# Altium footprint library ref-packages.PCBLIB: 1543 footprints (part 75 of 103)
Each footprint in its own frame and in the unit in brackets; x right, y up, seen from the top. Pads: shape width x height; smd on the part's side, far side on the other; paste and mask are expansions set on the pad; w line width, h text height; cw(c..) or ccw(c..) is an arc to the next point about the centre after c.
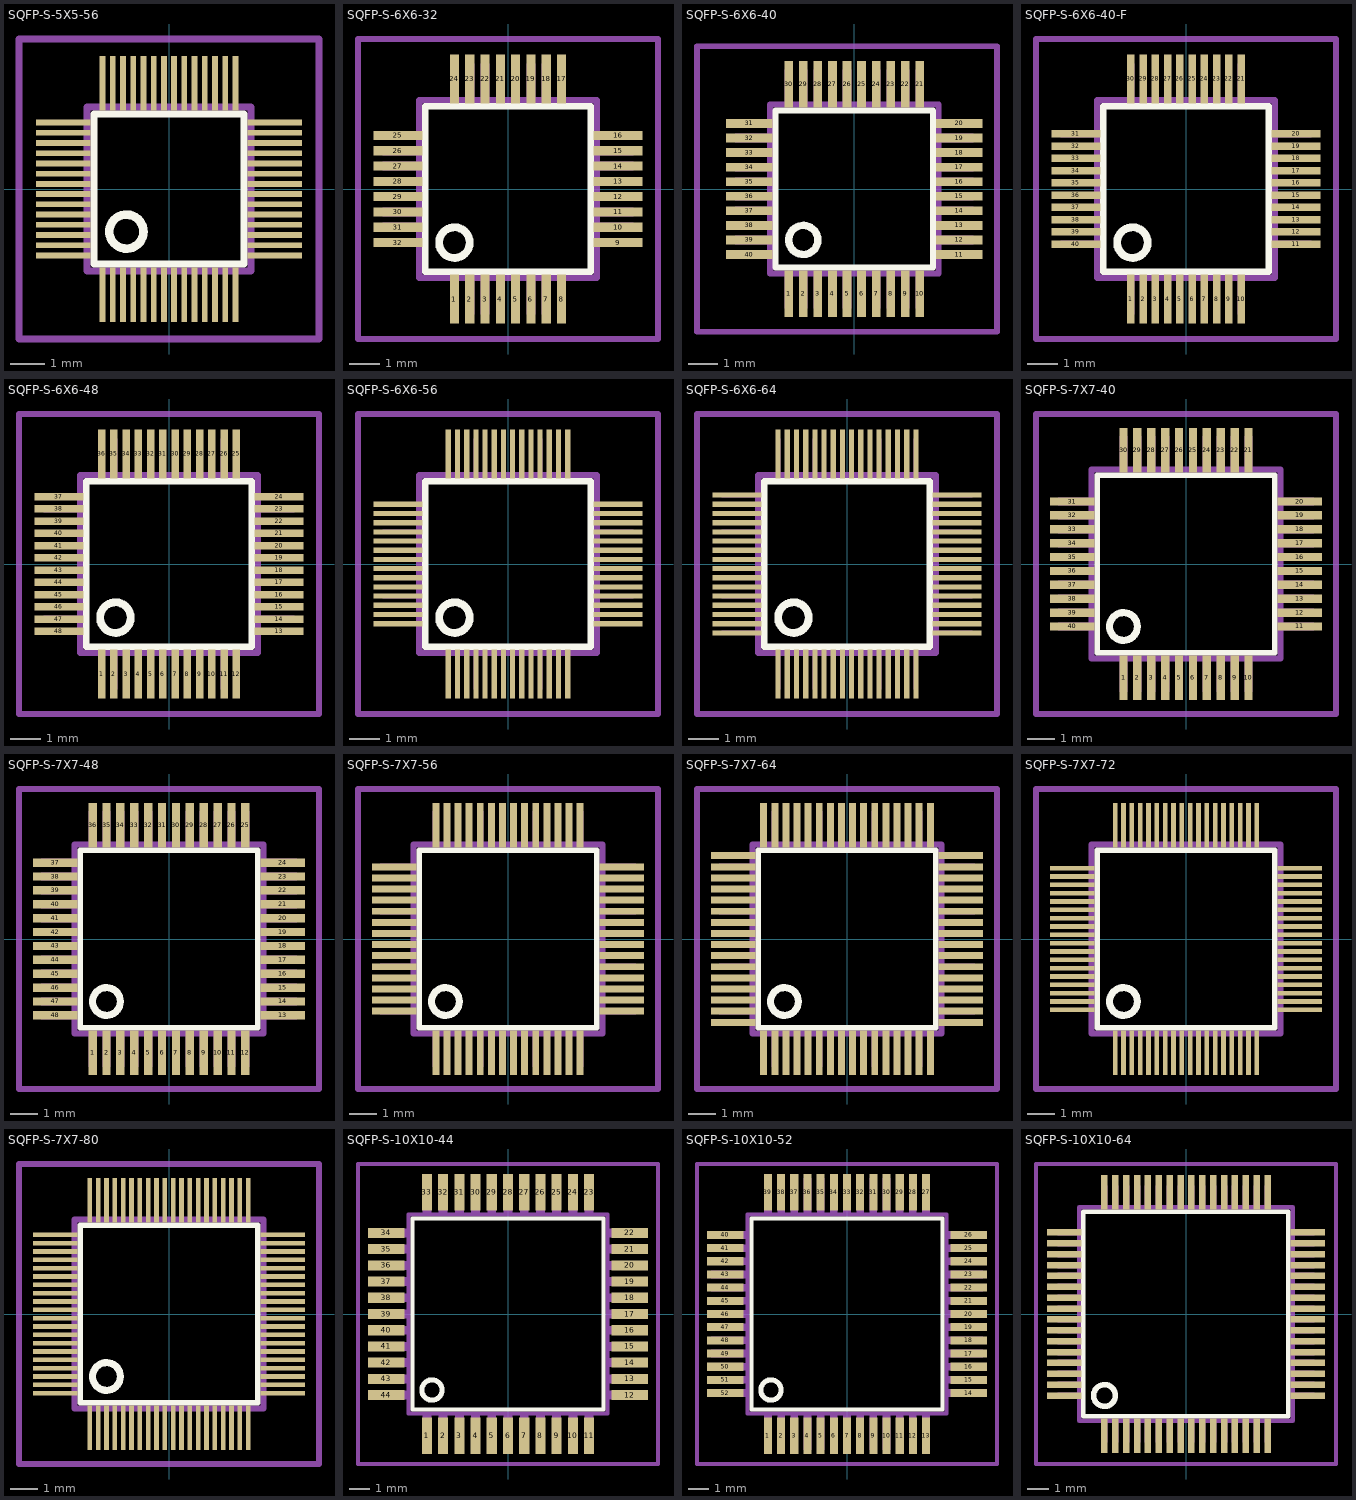
[diagram p74: the footprints below, top view; thin cyan lines are the x and y axes]

## SQFP-S-5X5-56 [mm]
pads (56):
  rect 0.17x1.6 smd: 1(-1.95,-3.1) 2(-1.65,-3.1) 3(-1.35,-3.1) 4(-1.05,-3.1) 5(-0.75,-3.1) 6(-0.45,-3.1) 7(-0.15,-3.1) 8(0.15,-3.1) 9(0.45,-3.1) 10(0.75,-3.1) 11(1.05,-3.1) 12(1.35,-3.1) 13(1.65,-3.1) 14(1.95,-3.1) 29(1.95,3.1) 30(1.65,3.1) 31(1.35,3.1) 32(1.05,3.1) 33(0.75,3.1) 34(0.45,3.1) 35(0.15,3.1) 36(-0.15,3.1) 37(-0.45,3.1) 38(-0.75,3.1) 39(-1.05,3.1) 40(-1.35,3.1) 41(-1.65,3.1) 42(-1.95,3.1)
  rect 1.6x0.17 smd: 15(3.1,-1.95) 16(3.1,-1.65) 17(3.1,-1.35) 18(3.1,-1.05) 19(3.1,-0.75) 20(3.1,-0.45) 21(3.1,-0.15) 22(3.1,0.15) 23(3.1,0.45) 24(3.1,0.75) 25(3.1,1.05) 26(3.1,1.35) 27(3.1,1.65) 28(3.1,1.95) 43(-3.1,1.95) 44(-3.1,1.65) 45(-3.1,1.35) 46(-3.1,1.05) 47(-3.1,0.75) 48(-3.1,0.45) 49(-3.1,0.15) 50(-3.1,-0.15) 51(-3.1,-0.45) 52(-3.1,-0.75) 53(-3.1,-1.05) 54(-3.1,-1.35) 55(-3.1,-1.65) 56(-3.1,-1.95)
Top Overlay:
  circle w0.254: c-1.25,-1.25 r0.5
  lines w0.203: -2.2,-2.2 2.2,-2.2 2.2,2.2 -2.2,2.2 -2.2,-2.2
Mechanical 16:
  rectangle: -2.02,-3.6 -1.88,-2.45
  rectangle: -1.72,-3.6 -1.58,-2.45
  rectangle: -1.42,-3.6 -1.28,-2.45
  rectangle: -1.12,-3.6 -0.98,-2.45
  rectangle: -0.82,-3.6 -0.68,-2.45
  rectangle: -0.52,-3.6 -0.38,-2.45
  rectangle: -0.22,-3.6 -0.08,-2.45
  rectangle: 0.08,-3.6 0.22,-2.45
  rectangle: 0.38,-3.6 0.52,-2.45
  rectangle: 0.68,-3.6 0.82,-2.45
  rectangle: 0.98,-3.6 1.12,-2.45
  rectangle: 1.28,-3.6 1.42,-2.45
  rectangle: 1.58,-3.6 1.72,-2.45
  rectangle: 1.88,-3.6 2.02,-2.45
  rectangle: 2.45,-2.02 3.6,-1.88
  rectangle: 2.45,-1.72 3.6,-1.58
  rectangle: 2.45,-1.42 3.6,-1.28
  rectangle: 2.45,-1.12 3.6,-0.98
  rectangle: 2.45,-0.82 3.6,-0.68
  rectangle: 2.45,-0.52 3.6,-0.38
  rectangle: 2.45,-0.22 3.6,-0.08
  rectangle: 2.45,0.08 3.6,0.22
  rectangle: 2.45,0.38 3.6,0.52
  rectangle: 2.45,0.68 3.6,0.82
  rectangle: 2.45,0.98 3.6,1.12
  rectangle: 2.45,1.28 3.6,1.42
  rectangle: 2.45,1.58 3.6,1.72
  rectangle: 2.45,1.88 3.6,2.02
  rectangle: 1.88,2.45 2.02,3.6
  rectangle: 1.58,2.45 1.72,3.6
  rectangle: 1.28,2.45 1.42,3.6
  rectangle: 0.98,2.45 1.12,3.6
  rectangle: 0.68,2.45 0.82,3.6
  rectangle: 0.38,2.45 0.52,3.6
  rectangle: 0.08,2.45 0.22,3.6
  rectangle: -0.22,2.45 -0.08,3.6
  rectangle: -0.52,2.45 -0.38,3.6
  rectangle: -0.82,2.45 -0.68,3.6
  rectangle: -1.12,2.45 -0.98,3.6
  rectangle: -1.42,2.45 -1.28,3.6
  rectangle: -1.72,2.45 -1.58,3.6
  rectangle: -2.02,2.45 -1.88,3.6
  rectangle: -3.6,1.88 -2.45,2.02
  rectangle: -3.6,1.58 -2.45,1.72
  rectangle: -3.6,1.28 -2.45,1.42
  rectangle: -3.6,0.98 -2.45,1.12
  rectangle: -3.6,0.68 -2.45,0.82
  rectangle: -3.6,0.38 -2.45,0.52
  rectangle: -3.6,0.08 -2.45,0.22
  rectangle: -3.6,-0.22 -2.45,-0.08
  rectangle: -3.6,-0.52 -2.45,-0.38
  rectangle: -3.6,-0.82 -2.45,-0.68
  rectangle: -3.6,-1.12 -2.45,-0.98
  rectangle: -3.6,-1.42 -2.45,-1.28
  rectangle: -3.6,-1.72 -2.45,-1.58
  rectangle: -3.6,-2.02 -2.45,-1.88
  lines w0.203: -2.4,-2.4 2.4,-2.4 2.4,2.4 -2.4,2.4 -2.4,-2.4
Mechanical 27:
  lines w0.2: -4.4,-4.4 -4.4,4.4 4.4,4.4 4.4,-4.4 -4.4,-4.4

## SQFP-S-6X6-32 [mil]
pads (32):
  rect 11.81x62.99 smd: 1(-68.9,-141.73) 2(-49.21,-141.73) 3(-29.53,-141.73) 4(-9.84,-141.73) 5(9.84,-141.73) 6(29.53,-141.73) 7(49.21,-141.73) 8(68.9,-141.73) 17(68.9,141.73) 18(49.21,141.73) 19(29.53,141.73) 20(9.84,141.73) 21(-9.84,141.73) 22(-29.53,141.73) 23(-49.21,141.73) 24(-68.9,141.73)
  rect 62.99x11.81 smd: 9(141.73,-68.9) 10(141.73,-49.21) 11(141.73,-29.53) 12(141.73,-9.84) 13(141.73,9.84) 14(141.73,29.53) 15(141.73,49.21) 16(141.73,68.9) 25(-141.73,68.9) 26(-141.73,49.21) 27(-141.73,29.53) 28(-141.73,9.84) 29(-141.73,-9.84) 30(-141.73,-29.53) 31(-141.73,-49.21) 32(-141.73,-68.9)
Top Overlay:
  circle w10: c-68.9,-68.9 r19.69
  lines w8: -106.3,-106.3 106.3,-106.3 106.3,106.3 -106.3,106.3 -106.3,-106.3
Mechanical 16:
  rectangle: -74.8,-161.42 -62.99,-116.14
  rectangle: -55.12,-161.42 -43.31,-116.14
  rectangle: -35.43,-161.42 -23.62,-116.14
  rectangle: -15.75,-161.42 -3.94,-116.14
  rectangle: 3.94,-161.42 15.75,-116.14
  rectangle: 23.62,-161.42 35.43,-116.14
  rectangle: 43.31,-161.42 55.12,-116.14
  rectangle: 62.99,-161.42 74.8,-116.14
  rectangle: 116.14,-74.8 161.42,-62.99
  rectangle: 116.14,-55.12 161.42,-43.31
  rectangle: 116.14,-35.43 161.42,-23.62
  rectangle: 116.14,-15.75 161.42,-3.94
  rectangle: 116.14,3.94 161.42,15.75
  rectangle: 116.14,23.62 161.42,35.43
  rectangle: 116.14,43.31 161.42,55.12
  rectangle: 116.14,62.99 161.42,74.8
  rectangle: 62.99,116.14 74.8,161.42
  rectangle: 43.31,116.14 55.12,161.42
  rectangle: 23.62,116.14 35.43,161.42
  rectangle: 3.94,116.14 15.75,161.42
  rectangle: -15.75,116.14 -3.94,161.42
  rectangle: -35.43,116.14 -23.62,161.42
  rectangle: -55.12,116.14 -43.31,161.42
  rectangle: -74.8,116.14 -62.99,161.42
  rectangle: -161.42,62.99 -116.14,74.8
  rectangle: -161.42,43.31 -116.14,55.12
  rectangle: -161.42,23.62 -116.14,35.43
  rectangle: -161.42,3.94 -116.14,15.75
  rectangle: -161.42,-15.75 -116.14,-3.94
  rectangle: -161.42,-35.43 -116.14,-23.62
  rectangle: -161.42,-55.12 -116.14,-43.31
  rectangle: -161.42,-74.8 -116.14,-62.99
  lines w8: -114.17,-114.17 114.17,-114.17 114.17,114.17 -114.17,114.17 -114.17,-114.17
Mechanical 27:
  lines w7.87: -192.91,-192.91 -192.91,192.91 192.91,192.91 192.91,-192.91 -192.91,-192.91

## SQFP-S-6X6-40 [mil]
pads (40):
  rect 11.81x62.99 smd: 1(-88.58,-141.73) 2(-68.9,-141.73) 3(-49.21,-141.73) 4(-29.53,-141.73) 5(-9.84,-141.73) 6(9.84,-141.73) 7(29.53,-141.73) 8(49.21,-141.73) 9(68.9,-141.73) 10(88.58,-141.73) 21(88.58,141.73) 22(68.9,141.73) 23(49.21,141.73) 24(29.53,141.73) 25(9.84,141.73) 26(-9.84,141.73) 27(-29.53,141.73) 28(-49.21,141.73) 29(-68.9,141.73) 30(-88.58,141.73)
  rect 62.99x11.81 smd: 11(141.73,-88.58) 12(141.73,-68.9) 13(141.73,-49.21) 14(141.73,-29.53) 15(141.73,-9.84) 16(141.73,9.84) 17(141.73,29.53) 18(141.73,49.21) 19(141.73,68.9) 20(141.73,88.58) 31(-141.73,88.58) 32(-141.73,68.9) 33(-141.73,49.21) 34(-141.73,29.53) 35(-141.73,9.84) 36(-141.73,-9.84) 37(-141.73,-29.53) 38(-141.73,-49.21) 39(-141.73,-68.9) 40(-141.73,-88.58)
Top Overlay:
  circle w10: c-68.9,-68.9 r19.69
  lines w8: -106.3,-106.3 106.3,-106.3 106.3,106.3 -106.3,106.3 -106.3,-106.3
Mechanical 16:
  rectangle: -94.49,-161.42 -82.68,-116.14
  rectangle: -74.8,-161.42 -62.99,-116.14
  rectangle: -55.12,-161.42 -43.31,-116.14
  rectangle: -35.43,-161.42 -23.62,-116.14
  rectangle: -15.75,-161.42 -3.94,-116.14
  rectangle: 3.94,-161.42 15.75,-116.14
  rectangle: 23.62,-161.42 35.43,-116.14
  rectangle: 43.31,-161.42 55.12,-116.14
  rectangle: 62.99,-161.42 74.8,-116.14
  rectangle: 82.68,-161.42 94.49,-116.14
  rectangle: 116.14,-94.49 161.42,-82.68
  rectangle: 116.14,-74.8 161.42,-62.99
  rectangle: 116.14,-55.12 161.42,-43.31
  rectangle: 116.14,-35.43 161.42,-23.62
  rectangle: 116.14,-15.75 161.42,-3.94
  rectangle: 116.14,3.94 161.42,15.75
  rectangle: 116.14,23.62 161.42,35.43
  rectangle: 116.14,43.31 161.42,55.12
  rectangle: 116.14,62.99 161.42,74.8
  rectangle: 116.14,82.68 161.42,94.49
  rectangle: 82.68,116.14 94.49,161.42
  rectangle: 62.99,116.14 74.8,161.42
  rectangle: 43.31,116.14 55.12,161.42
  rectangle: 23.62,116.14 35.43,161.42
  rectangle: 3.94,116.14 15.75,161.42
  rectangle: -15.75,116.14 -3.94,161.42
  rectangle: -35.43,116.14 -23.62,161.42
  rectangle: -55.12,116.14 -43.31,161.42
  rectangle: -74.8,116.14 -62.99,161.42
  rectangle: -94.49,116.14 -82.68,161.42
  rectangle: -161.42,82.68 -116.14,94.49
  rectangle: -161.42,62.99 -116.14,74.8
  rectangle: -161.42,43.31 -116.14,55.12
  rectangle: -161.42,23.62 -116.14,35.43
  rectangle: -161.42,3.94 -116.14,15.75
  rectangle: -161.42,-15.75 -116.14,-3.94
  rectangle: -161.42,-35.43 -116.14,-23.62
  rectangle: -161.42,-55.12 -116.14,-43.31
  rectangle: -161.42,-74.8 -116.14,-62.99
  rectangle: -161.42,-94.49 -116.14,-82.68
  lines w8: -114.17,-114.17 114.17,-114.17 114.17,114.17 -114.17,114.17 -114.17,-114.17
Mechanical 27:
  lines w7.87: -212.6,-192.91 -212.6,192.91 192.91,192.91 192.91,-192.91 -212.6,-192.91

## SQFP-S-6X6-40-F [mm]
pads (40):
  rect 0.25x1.6 smd: 1(-1.8,-3.6) 2(-1.4,-3.6) 3(-1,-3.6) 4(-0.6,-3.6) 5(-0.2,-3.6) 6(0.2,-3.6) 7(0.6,-3.6) 8(1,-3.6) 9(1.4,-3.6) 10(1.8,-3.6) 21(1.8,3.6) 22(1.4,3.6) 23(1,3.6) 24(0.6,3.6) 25(0.2,3.6) 26(-0.2,3.6) 27(-0.6,3.6) 28(-1,3.6) 29(-1.4,3.6) 30(-1.8,3.6)
  rect 1.6x0.25 smd: 11(3.6,-1.8) 12(3.6,-1.4) 13(3.6,-1) 14(3.6,-0.6) 15(3.6,-0.2) 16(3.6,0.2) 17(3.6,0.6) 18(3.6,1) 19(3.6,1.4) 20(3.6,1.8) 31(-3.6,1.8) 32(-3.6,1.4) 33(-3.6,1) 34(-3.6,0.6) 35(-3.6,0.2) 36(-3.6,-0.2) 37(-3.6,-0.6) 38(-3.6,-1) 39(-3.6,-1.4) 40(-3.6,-1.8)
Top Overlay:
  circle w0.254: c-1.75,-1.75 r0.5
  lines w0.203: -2.7,-2.7 2.7,-2.7 2.7,2.7 -2.7,2.7 -2.7,-2.7
Mechanical 16:
  rectangle: -1.91,-4.1 -1.69,-2.95
  rectangle: -1.51,-4.1 -1.29,-2.95
  rectangle: -1.11,-4.1 -0.89,-2.95
  rectangle: -0.71,-4.1 -0.49,-2.95
  rectangle: -0.31,-4.1 -0.09,-2.95
  rectangle: 0.09,-4.1 0.31,-2.95
  rectangle: 0.49,-4.1 0.71,-2.95
  rectangle: 0.89,-4.1 1.11,-2.95
  rectangle: 1.29,-4.1 1.51,-2.95
  rectangle: 1.69,-4.1 1.91,-2.95
  rectangle: 2.95,-1.91 4.1,-1.69
  rectangle: 2.95,-1.51 4.1,-1.29
  rectangle: 2.95,-1.11 4.1,-0.89
  rectangle: 2.95,-0.71 4.1,-0.49
  rectangle: 2.95,-0.31 4.1,-0.09
  rectangle: 2.95,0.09 4.1,0.31
  rectangle: 2.95,0.49 4.1,0.71
  rectangle: 2.95,0.89 4.1,1.11
  rectangle: 2.95,1.29 4.1,1.51
  rectangle: 2.95,1.69 4.1,1.91
  rectangle: 1.69,2.95 1.91,4.1
  rectangle: 1.29,2.95 1.51,4.1
  rectangle: 0.89,2.95 1.11,4.1
  rectangle: 0.49,2.95 0.71,4.1
  rectangle: 0.09,2.95 0.31,4.1
  rectangle: -0.31,2.95 -0.09,4.1
  rectangle: -0.71,2.95 -0.49,4.1
  rectangle: -1.11,2.95 -0.89,4.1
  rectangle: -1.51,2.95 -1.29,4.1
  rectangle: -1.91,2.95 -1.69,4.1
  rectangle: -4.1,1.69 -2.95,1.91
  rectangle: -4.1,1.29 -2.95,1.51
  rectangle: -4.1,0.89 -2.95,1.11
  rectangle: -4.1,0.49 -2.95,0.71
  rectangle: -4.1,0.09 -2.95,0.31
  rectangle: -4.1,-0.31 -2.95,-0.09
  rectangle: -4.1,-0.71 -2.95,-0.49
  rectangle: -4.1,-1.11 -2.95,-0.89
  rectangle: -4.1,-1.51 -2.95,-1.29
  rectangle: -4.1,-1.91 -2.95,-1.69
  lines w0.203: -2.9,-2.9 2.9,-2.9 2.9,2.9 -2.9,2.9 -2.9,-2.9
Mechanical 27:
  lines w0.2: -4.9,-4.9 -4.9,4.9 4.9,4.9 4.9,-4.9 -4.9,-4.9

## SQFP-S-6X6-48 [mm]
pads (48):
  rect 0.25x1.6 smd: 1(-2.2,-3.6) 2(-1.8,-3.6) 3(-1.4,-3.6) 4(-1,-3.6) 5(-0.6,-3.6) 6(-0.2,-3.6) 7(0.2,-3.6) 8(0.6,-3.6) 9(1,-3.6) 10(1.4,-3.6) 11(1.8,-3.6) 12(2.2,-3.6) 25(2.2,3.6) 26(1.8,3.6) 27(1.4,3.6) 28(1,3.6) 29(0.6,3.6) 30(0.2,3.6) 31(-0.2,3.6) 32(-0.6,3.6) 33(-1,3.6) 34(-1.4,3.6) 35(-1.8,3.6) 36(-2.2,3.6)
  rect 1.6x0.25 smd: 13(3.6,-2.2) 14(3.6,-1.8) 15(3.6,-1.4) 16(3.6,-1) 17(3.6,-0.6) 18(3.6,-0.2) 19(3.6,0.2) 20(3.6,0.6) 21(3.6,1) 22(3.6,1.4) 23(3.6,1.8) 24(3.6,2.2) 37(-3.6,2.2) 38(-3.6,1.8) 39(-3.6,1.4) 40(-3.6,1) 41(-3.6,0.6) 42(-3.6,0.2) 43(-3.6,-0.2) 44(-3.6,-0.6) 45(-3.6,-1) 46(-3.6,-1.4) 47(-3.6,-1.8) 48(-3.6,-2.2)
Top Overlay:
  circle w0.254: c-1.75,-1.75 r0.5
  lines w0.203: -2.7,-2.7 2.7,-2.7 2.7,2.7 -2.7,2.7 -2.7,-2.7
Mechanical 16:
  rectangle: -2.31,-4.1 -2.09,-2.95
  rectangle: -1.91,-4.1 -1.69,-2.95
  rectangle: -1.51,-4.1 -1.29,-2.95
  rectangle: -1.11,-4.1 -0.89,-2.95
  rectangle: -0.71,-4.1 -0.49,-2.95
  rectangle: -0.31,-4.1 -0.09,-2.95
  rectangle: 0.09,-4.1 0.31,-2.95
  rectangle: 0.49,-4.1 0.71,-2.95
  rectangle: 0.89,-4.1 1.11,-2.95
  rectangle: 1.29,-4.1 1.51,-2.95
  rectangle: 1.69,-4.1 1.91,-2.95
  rectangle: 2.09,-4.1 2.31,-2.95
  rectangle: 2.95,-2.31 4.1,-2.09
  rectangle: 2.95,-1.91 4.1,-1.69
  rectangle: 2.95,-1.51 4.1,-1.29
  rectangle: 2.95,-1.11 4.1,-0.89
  rectangle: 2.95,-0.71 4.1,-0.49
  rectangle: 2.95,-0.31 4.1,-0.09
  rectangle: 2.95,0.09 4.1,0.31
  rectangle: 2.95,0.49 4.1,0.71
  rectangle: 2.95,0.89 4.1,1.11
  rectangle: 2.95,1.29 4.1,1.51
  rectangle: 2.95,1.69 4.1,1.91
  rectangle: 2.95,2.09 4.1,2.31
  rectangle: 2.09,2.95 2.31,4.1
  rectangle: 1.69,2.95 1.91,4.1
  rectangle: 1.29,2.95 1.51,4.1
  rectangle: 0.89,2.95 1.11,4.1
  rectangle: 0.49,2.95 0.71,4.1
  rectangle: 0.09,2.95 0.31,4.1
  rectangle: -0.31,2.95 -0.09,4.1
  rectangle: -0.71,2.95 -0.49,4.1
  rectangle: -1.11,2.95 -0.89,4.1
  rectangle: -1.51,2.95 -1.29,4.1
  rectangle: -1.91,2.95 -1.69,4.1
  rectangle: -2.31,2.95 -2.09,4.1
  rectangle: -4.1,2.09 -2.95,2.31
  rectangle: -4.1,1.69 -2.95,1.91
  rectangle: -4.1,1.29 -2.95,1.51
  rectangle: -4.1,0.89 -2.95,1.11
  rectangle: -4.1,0.49 -2.95,0.71
  rectangle: -4.1,0.09 -2.95,0.31
  rectangle: -4.1,-0.31 -2.95,-0.09
  rectangle: -4.1,-0.71 -2.95,-0.49
  rectangle: -4.1,-1.11 -2.95,-0.89
  rectangle: -4.1,-1.51 -2.95,-1.29
  rectangle: -4.1,-1.91 -2.95,-1.69
  rectangle: -4.1,-2.31 -2.95,-2.09
  lines w0.203: -2.9,-2.9 2.9,-2.9 2.9,2.9 -2.9,2.9 -2.9,-2.9
Mechanical 27:
  lines w0.2: -4.9,-4.9 -4.9,4.9 4.9,4.9 4.9,-4.9 -4.9,-4.9

## SQFP-S-6X6-56 [mm]
pads (56):
  rect 0.17x1.6 smd: 1(-1.95,-3.6) 2(-1.65,-3.6) 3(-1.35,-3.6) 4(-1.05,-3.6) 5(-0.75,-3.6) 6(-0.45,-3.6) 7(-0.15,-3.6) 8(0.15,-3.6) 9(0.45,-3.6) 10(0.75,-3.6) 11(1.05,-3.6) 12(1.35,-3.6) 13(1.65,-3.6) 14(1.95,-3.6) 29(1.95,3.6) 30(1.65,3.6) 31(1.35,3.6) 32(1.05,3.6) 33(0.75,3.6) 34(0.45,3.6) 35(0.15,3.6) 36(-0.15,3.6) 37(-0.45,3.6) 38(-0.75,3.6) 39(-1.05,3.6) 40(-1.35,3.6) 41(-1.65,3.6) 42(-1.95,3.6)
  rect 1.6x0.17 smd: 15(3.6,-1.95) 16(3.6,-1.65) 17(3.6,-1.35) 18(3.6,-1.05) 19(3.6,-0.75) 20(3.6,-0.45) 21(3.6,-0.15) 22(3.6,0.15) 23(3.6,0.45) 24(3.6,0.75) 25(3.6,1.05) 26(3.6,1.35) 27(3.6,1.65) 28(3.6,1.95) 43(-3.6,1.95) 44(-3.6,1.65) 45(-3.6,1.35) 46(-3.6,1.05) 47(-3.6,0.75) 48(-3.6,0.45) 49(-3.6,0.15) 50(-3.6,-0.15) 51(-3.6,-0.45) 52(-3.6,-0.75) 53(-3.6,-1.05) 54(-3.6,-1.35) 55(-3.6,-1.65) 56(-3.6,-1.95)
Top Overlay:
  circle w0.254: c-1.75,-1.75 r0.5
  lines w0.203: -2.7,-2.7 2.7,-2.7 2.7,2.7 -2.7,2.7 -2.7,-2.7
Mechanical 16:
  rectangle: -2.02,-4.1 -1.88,-2.95
  rectangle: -1.72,-4.1 -1.58,-2.95
  rectangle: -1.42,-4.1 -1.28,-2.95
  rectangle: -1.12,-4.1 -0.98,-2.95
  rectangle: -0.82,-4.1 -0.68,-2.95
  rectangle: -0.52,-4.1 -0.38,-2.95
  rectangle: -0.22,-4.1 -0.08,-2.95
  rectangle: 0.08,-4.1 0.22,-2.95
  rectangle: 0.38,-4.1 0.52,-2.95
  rectangle: 0.68,-4.1 0.82,-2.95
  rectangle: 0.98,-4.1 1.12,-2.95
  rectangle: 1.28,-4.1 1.42,-2.95
  rectangle: 1.58,-4.1 1.72,-2.95
  rectangle: 1.88,-4.1 2.02,-2.95
  rectangle: 2.95,-2.02 4.1,-1.88
  rectangle: 2.95,-1.72 4.1,-1.58
  rectangle: 2.95,-1.42 4.1,-1.28
  rectangle: 2.95,-1.12 4.1,-0.98
  rectangle: 2.95,-0.82 4.1,-0.68
  rectangle: 2.95,-0.52 4.1,-0.38
  rectangle: 2.95,-0.22 4.1,-0.08
  rectangle: 2.95,0.08 4.1,0.22
  rectangle: 2.95,0.38 4.1,0.52
  rectangle: 2.95,0.68 4.1,0.82
  rectangle: 2.95,0.98 4.1,1.12
  rectangle: 2.95,1.28 4.1,1.42
  rectangle: 2.95,1.58 4.1,1.72
  rectangle: 2.95,1.88 4.1,2.02
  rectangle: 1.88,2.95 2.02,4.1
  rectangle: 1.58,2.95 1.72,4.1
  rectangle: 1.28,2.95 1.42,4.1
  rectangle: 0.98,2.95 1.12,4.1
  rectangle: 0.68,2.95 0.82,4.1
  rectangle: 0.38,2.95 0.52,4.1
  rectangle: 0.08,2.95 0.22,4.1
  rectangle: -0.22,2.95 -0.08,4.1
  rectangle: -0.52,2.95 -0.38,4.1
  rectangle: -0.82,2.95 -0.68,4.1
  rectangle: -1.12,2.95 -0.98,4.1
  rectangle: -1.42,2.95 -1.28,4.1
  rectangle: -1.72,2.95 -1.58,4.1
  rectangle: -2.02,2.95 -1.88,4.1
  rectangle: -4.1,1.88 -2.95,2.02
  rectangle: -4.1,1.58 -2.95,1.72
  rectangle: -4.1,1.28 -2.95,1.42
  rectangle: -4.1,0.98 -2.95,1.12
  rectangle: -4.1,0.68 -2.95,0.82
  rectangle: -4.1,0.38 -2.95,0.52
  rectangle: -4.1,0.08 -2.95,0.22
  rectangle: -4.1,-0.22 -2.95,-0.08
  rectangle: -4.1,-0.52 -2.95,-0.38
  rectangle: -4.1,-0.82 -2.95,-0.68
  rectangle: -4.1,-1.12 -2.95,-0.98
  rectangle: -4.1,-1.42 -2.95,-1.28
  rectangle: -4.1,-1.72 -2.95,-1.58
  rectangle: -4.1,-2.02 -2.95,-1.88
  lines w0.203: -2.9,-2.9 2.9,-2.9 2.9,2.9 -2.9,2.9 -2.9,-2.9
Mechanical 27:
  lines w0.2: -4.9,-4.9 -4.9,4.9 4.9,4.9 4.9,-4.9 -4.9,-4.9

## SQFP-S-6X6-64 [mm]
pads (64):
  rect 0.17x1.6 smd: 1(-2.25,-3.6) 2(-1.95,-3.6) 3(-1.65,-3.6) 4(-1.35,-3.6) 5(-1.05,-3.6) 6(-0.75,-3.6) 7(-0.45,-3.6) 8(-0.15,-3.6) 9(0.15,-3.6) 10(0.45,-3.6) 11(0.75,-3.6) 12(1.05,-3.6) 13(1.35,-3.6) 14(1.65,-3.6) 15(1.95,-3.6) 16(2.25,-3.6) 33(2.25,3.6) 34(1.95,3.6) 35(1.65,3.6) 36(1.35,3.6) 37(1.05,3.6) 38(0.75,3.6) 39(0.45,3.6) 40(0.15,3.6) 41(-0.15,3.6) 42(-0.45,3.6) 43(-0.75,3.6) 44(-1.05,3.6) 45(-1.35,3.6) 46(-1.65,3.6) 47(-1.95,3.6) 48(-2.25,3.6)
  rect 1.6x0.17 smd: 17(3.6,-2.25) 18(3.6,-1.95) 19(3.6,-1.65) 20(3.6,-1.35) 21(3.6,-1.05) 22(3.6,-0.75) 23(3.6,-0.45) 24(3.6,-0.15) 25(3.6,0.15) 26(3.6,0.45) 27(3.6,0.75) 28(3.6,1.05) 29(3.6,1.35) 30(3.6,1.65) 31(3.6,1.95) 32(3.6,2.25) 49(-3.6,2.25) 50(-3.6,1.95) 51(-3.6,1.65) 52(-3.6,1.35) 53(-3.6,1.05) 54(-3.6,0.75) 55(-3.6,0.45) 56(-3.6,0.15) 57(-3.6,-0.15) 58(-3.6,-0.45) 59(-3.6,-0.75) 60(-3.6,-1.05) 61(-3.6,-1.35) 62(-3.6,-1.65) 63(-3.6,-1.95) 64(-3.6,-2.25)
Top Overlay:
  circle w0.254: c-1.75,-1.75 r0.5
  lines w0.203: -2.7,-2.7 2.7,-2.7 2.7,2.7 -2.7,2.7 -2.7,-2.7
Mechanical 16:
  rectangle: -2.32,-4.1 -2.18,-2.95
  rectangle: -2.02,-4.1 -1.88,-2.95
  rectangle: -1.72,-4.1 -1.58,-2.95
  rectangle: -1.42,-4.1 -1.28,-2.95
  rectangle: -1.12,-4.1 -0.98,-2.95
  rectangle: -0.82,-4.1 -0.68,-2.95
  rectangle: -0.52,-4.1 -0.38,-2.95
  rectangle: -0.22,-4.1 -0.08,-2.95
  rectangle: 0.08,-4.1 0.22,-2.95
  rectangle: 0.38,-4.1 0.52,-2.95
  rectangle: 0.68,-4.1 0.82,-2.95
  rectangle: 0.98,-4.1 1.12,-2.95
  rectangle: 1.28,-4.1 1.42,-2.95
  rectangle: 1.58,-4.1 1.72,-2.95
  rectangle: 1.88,-4.1 2.02,-2.95
  rectangle: 2.18,-4.1 2.32,-2.95
  rectangle: 2.95,-2.32 4.1,-2.18
  rectangle: 2.95,-2.02 4.1,-1.88
  rectangle: 2.95,-1.72 4.1,-1.58
  rectangle: 2.95,-1.42 4.1,-1.28
  rectangle: 2.95,-1.12 4.1,-0.98
  rectangle: 2.95,-0.82 4.1,-0.68
  rectangle: 2.95,-0.52 4.1,-0.38
  rectangle: 2.95,-0.22 4.1,-0.08
  rectangle: 2.95,0.08 4.1,0.22
  rectangle: 2.95,0.38 4.1,0.52
  rectangle: 2.95,0.68 4.1,0.82
  rectangle: 2.95,0.98 4.1,1.12
  rectangle: 2.95,1.28 4.1,1.42
  rectangle: 2.95,1.58 4.1,1.72
  rectangle: 2.95,1.88 4.1,2.02
  rectangle: 2.95,2.18 4.1,2.32
  rectangle: 2.18,2.95 2.32,4.1
  rectangle: 1.88,2.95 2.02,4.1
  rectangle: 1.58,2.95 1.72,4.1
  rectangle: 1.28,2.95 1.42,4.1
  rectangle: 0.98,2.95 1.12,4.1
  rectangle: 0.68,2.95 0.82,4.1
  rectangle: 0.38,2.95 0.52,4.1
  rectangle: 0.08,2.95 0.22,4.1
  rectangle: -0.22,2.95 -0.08,4.1
  rectangle: -0.52,2.95 -0.38,4.1
  rectangle: -0.82,2.95 -0.68,4.1
  rectangle: -1.12,2.95 -0.98,4.1
  rectangle: -1.42,2.95 -1.28,4.1
  rectangle: -1.72,2.95 -1.58,4.1
  rectangle: -2.02,2.95 -1.88,4.1
  rectangle: -2.32,2.95 -2.18,4.1
  rectangle: -4.1,2.18 -2.95,2.32
  rectangle: -4.1,1.88 -2.95,2.02
  rectangle: -4.1,1.58 -2.95,1.72
  rectangle: -4.1,1.28 -2.95,1.42
  rectangle: -4.1,0.98 -2.95,1.12
  rectangle: -4.1,0.68 -2.95,0.82
  rectangle: -4.1,0.38 -2.95,0.52
  rectangle: -4.1,0.08 -2.95,0.22
  rectangle: -4.1,-0.22 -2.95,-0.08
  rectangle: -4.1,-0.52 -2.95,-0.38
  rectangle: -4.1,-0.82 -2.95,-0.68
  rectangle: -4.1,-1.12 -2.95,-0.98
  rectangle: -4.1,-1.42 -2.95,-1.28
  rectangle: -4.1,-1.72 -2.95,-1.58
  rectangle: -4.1,-2.02 -2.95,-1.88
  rectangle: -4.1,-2.32 -2.95,-2.18
  lines w0.203: -2.9,-2.9 2.9,-2.9 2.9,2.9 -2.9,2.9 -2.9,-2.9
Mechanical 27:
  lines w0.2: -4.9,-4.9 -4.9,4.9 4.9,4.9 4.9,-4.9 -4.9,-4.9

## SQFP-S-7X7-40 [mil]
pads (40):
  rect 11.81x62.99 smd: 1(-88.58,-161.42) 2(-68.9,-161.42) 3(-49.21,-161.42) 4(-29.53,-161.42) 5(-9.84,-161.42) 6(9.84,-161.42) 7(29.53,-161.42) 8(49.21,-161.42) 9(68.9,-161.42) 10(88.58,-161.42) 21(88.58,161.42) 22(68.9,161.42) 23(49.21,161.42) 24(29.53,161.42) 25(9.84,161.42) 26(-9.84,161.42) 27(-29.53,161.42) 28(-49.21,161.42) 29(-68.9,161.42) 30(-88.58,161.42)
  rect 62.99x11.81 smd: 11(161.42,-88.58) 12(161.42,-68.9) 13(161.42,-49.21) 14(161.42,-29.53) 15(161.42,-9.84) 16(161.42,9.84) 17(161.42,29.53) 18(161.42,49.21) 19(161.42,68.9) 20(161.42,88.58) 31(-161.42,88.58) 32(-161.42,68.9) 33(-161.42,49.21) 34(-161.42,29.53) 35(-161.42,9.84) 36(-161.42,-9.84) 37(-161.42,-29.53) 38(-161.42,-49.21) 39(-161.42,-68.9) 40(-161.42,-88.58)
Top Overlay:
  circle w10: c-88.58,-88.58 r19.68
  lines w8: -125.98,-125.98 125.98,-125.98 125.98,125.98 -125.98,125.98 -125.98,-125.98
Mechanical 16:
  rectangle: -94.49,-181.1 -82.68,-135.83
  rectangle: -74.8,-181.1 -62.99,-135.83
  rectangle: -55.12,-181.1 -43.31,-135.83
  rectangle: -35.43,-181.1 -23.62,-135.83
  rectangle: -15.75,-181.1 -3.94,-135.83
  rectangle: 3.94,-181.1 15.75,-135.83
  rectangle: 23.62,-181.1 35.43,-135.83
  rectangle: 43.31,-181.1 55.12,-135.83
  rectangle: 62.99,-181.1 74.8,-135.83
  rectangle: 82.68,-181.1 94.49,-135.83
  rectangle: 135.83,-94.49 181.1,-82.68
  rectangle: 135.83,-74.8 181.1,-62.99
  rectangle: 135.83,-55.12 181.1,-43.31
  rectangle: 135.83,-35.43 181.1,-23.62
  rectangle: 135.83,-15.75 181.1,-3.94
  rectangle: 135.83,3.94 181.1,15.75
  rectangle: 135.83,23.62 181.1,35.43
  rectangle: 135.83,43.31 181.1,55.12
  rectangle: 135.83,62.99 181.1,74.8
  rectangle: 135.83,82.68 181.1,94.49
  rectangle: 82.68,135.83 94.49,181.1
  rectangle: 62.99,135.83 74.8,181.1
  rectangle: 43.31,135.83 55.12,181.1
  rectangle: 23.62,135.83 35.43,181.1
  rectangle: 3.94,135.83 15.75,181.1
  rectangle: -15.75,135.83 -3.94,181.1
  rectangle: -35.43,135.83 -23.62,181.1
  rectangle: -55.12,135.83 -43.31,181.1
  rectangle: -74.8,135.83 -62.99,181.1
  rectangle: -94.49,135.83 -82.68,181.1
  rectangle: -181.1,82.68 -135.83,94.49
  rectangle: -181.1,62.99 -135.83,74.8
  rectangle: -181.1,43.31 -135.83,55.12
  rectangle: -181.1,23.62 -135.83,35.43
  rectangle: -181.1,3.94 -135.83,15.75
  rectangle: -181.1,-15.75 -135.83,-3.94
  rectangle: -181.1,-35.43 -135.83,-23.62
  rectangle: -181.1,-55.12 -135.83,-43.31
  rectangle: -181.1,-74.8 -135.83,-62.99
  rectangle: -181.1,-94.49 -135.83,-82.68
  lines w8: -133.86,-133.86 133.86,-133.86 133.86,133.86 -133.86,133.86 -133.86,-133.86
Mechanical 27:
  lines w7.87: -212.6,-212.6 -212.6,212.6 212.6,212.6 212.6,-212.6 -212.6,-212.6
